# Altium footprint library my_AP_lib_pcb.PcbLib: 115 footprints (part 7 of 8)
Each footprint in its own frame and in the unit in brackets; x right, y up, seen from the top. Pads: shape width x height; smd on the part's side, far side on the other; paste and mask are expansions set on the pad; w line width, h text height; cw(c..) or ccw(c..) is an arc to the next point about the centre after c.
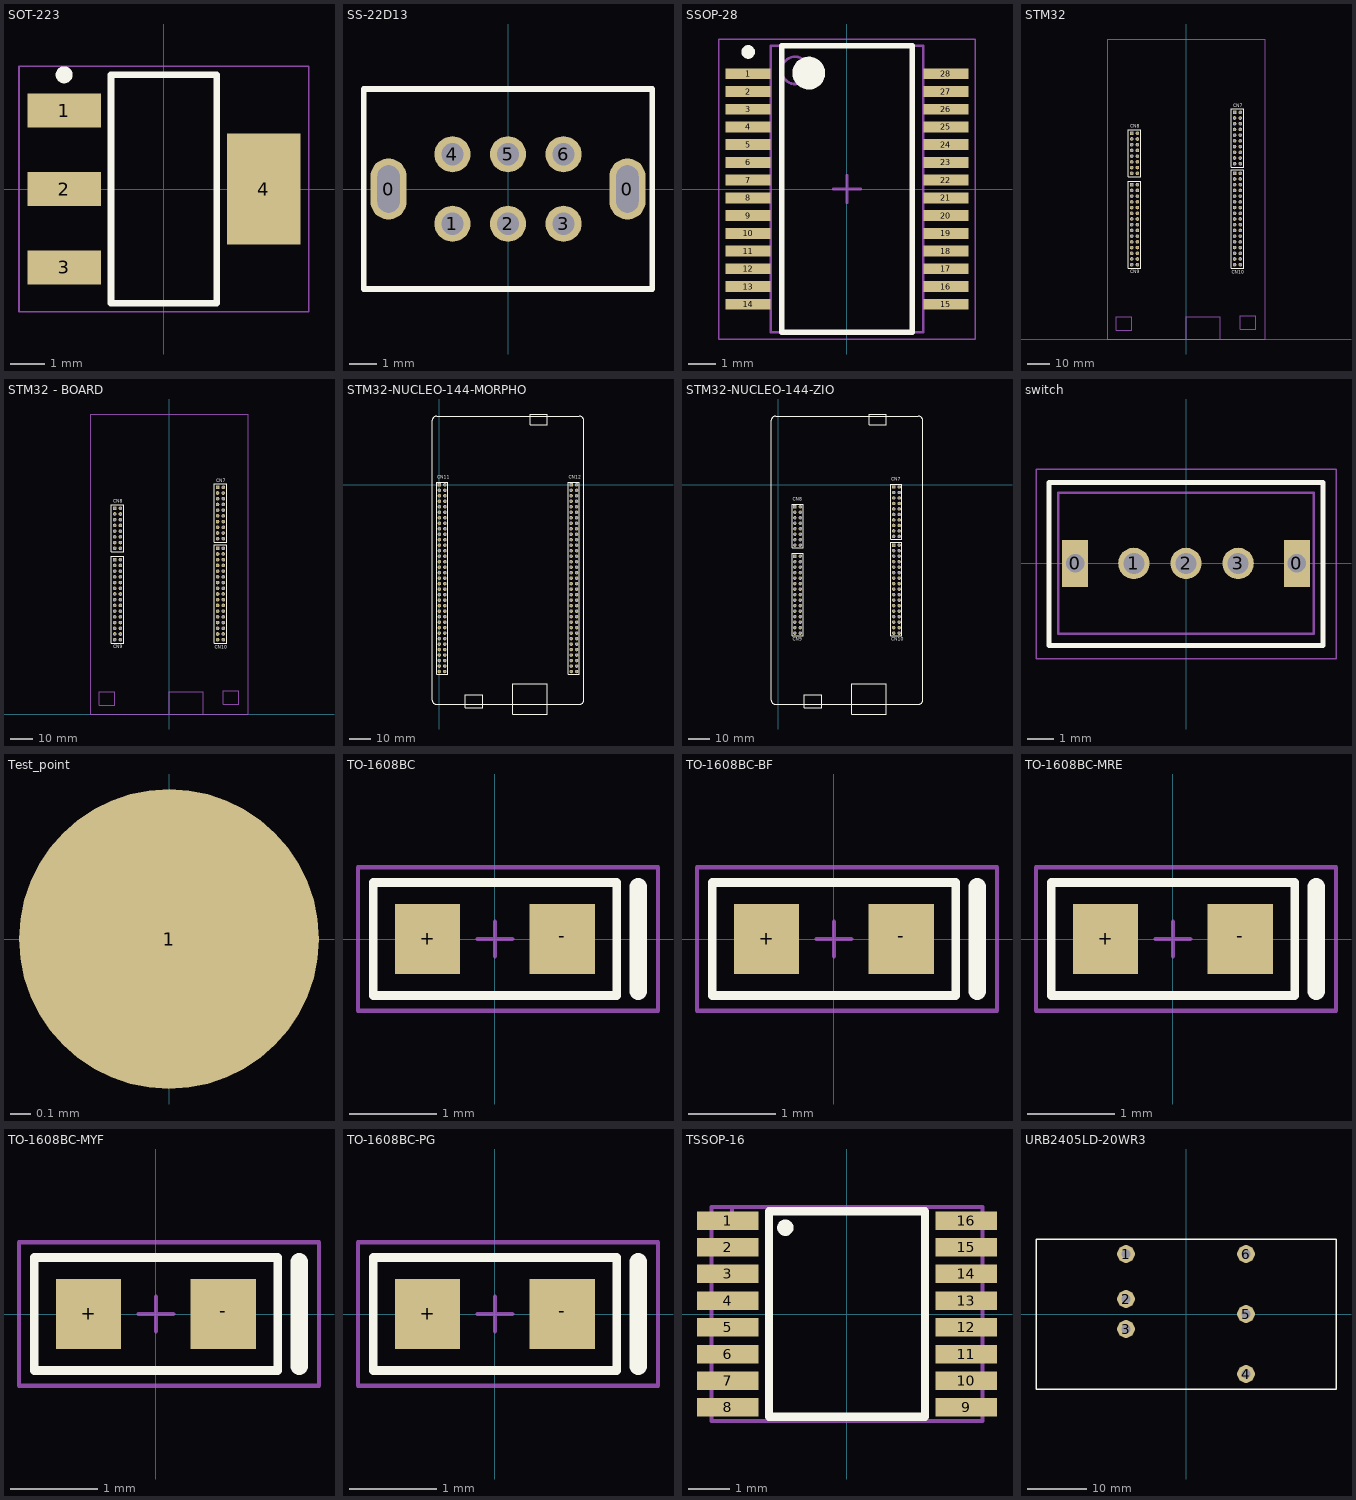
[diagram p6: the footprints below, top view; thin cyan lines are the x and y axes]

## SOT-223 [mm]
height 1.8
pads (4):
  rect 2.15x1 smd: 1(-2.925,2.3) 2(-2.925,0) 3(-2.925,-2.3)
  rect 2.15x3.25 smd: 4(2.925,0)
Top Overlay:
  circle w0.25: c-2.925,3.35 r0.125
  lines w0.2: -1.55,-3.35 1.55,-3.35 1.55,3.35 -1.55,3.35 -1.55,-3.35
Mechanical 15:
  lines w0.05: -4.25,-3.6 4.25,-3.6 4.25,3.6 -4.25,3.6 -4.25,-3.6
  text ".Designator" at -1.65,-0.2 h0.5
3D body "ALSRobot-SOT-223.step": height 1.64, standoff -0.01, extent -3.5,-3.25 3.5,3.25

## SS-22D13 [mm]
pads (8):
  oval 1.3x2.2 hole 0.8 slot 1.7 at 90 deg mask+0.05: 0(-4.3,0) 0(4.3,0)
  round 1.3 hole 0.8 mask+0.05: 1(-2,-1.25) 2(0,-1.25) 3(2,-1.25) 4(-2,1.25) 5(0,1.25) 6(2,1.25)
Top Overlay:
  lines w0.2: -5.2,-3.6 -5.2,3.6 5.2,3.6 5.2,-3.6 -5.2,-3.6
3D body "User Library-MFP213N.step": height 9, standoff -2.5, extent -4.3,-3.4 4.3,3.4

## SSOP-28 [mm] "SOP, 28-Leads, Body 10,20x5,30mm, Pitch 0,65mm, IPC Medium Density"
height 2
pads (28):
  rect 1.65x0.4 smd: 1(-3.625,4.225) 2(-3.625,3.575) 3(-3.625,2.925) 4(-3.625,2.275) 5(-3.625,1.625) 6(-3.625,0.975) 7(-3.625,0.325) 8(-3.625,-0.325) 9(-3.625,-0.975) 10(-3.625,-1.625) 11(-3.625,-2.275) 12(-3.625,-2.925) 13(-3.625,-3.575) 14(-3.625,-4.225) 15(3.625,-4.225) 16(3.625,-3.575) 17(3.625,-2.925) 18(3.625,-2.275) 19(3.625,-1.625) 20(3.625,-0.975) 21(3.625,-0.325) 22(3.625,0.325) 23(3.625,0.975) 24(3.625,1.625) 25(3.625,2.275) 26(3.625,2.925) 27(3.625,3.575) 28(3.625,4.225)
Top Overlay:
  circle w0.6: c-1.4,4.25 r0.3
  circle w0.25: c-3.625,5.025 r0.125
  lines w0.2: -2.4,-5.25 2.4,-5.25 2.4,5.25 -2.4,5.25 -2.4,-5.25
Mechanical 13:
  circle w0.1: c-1.9,4.35 r0.5
  lines w0.1: -2.8,-5.25 2.8,-5.25 2.8,5.25 -2.8,5.25 -2.8,-5.25
Mechanical 15:
  lines w0.05: -4.7,-5.5 4.7,-5.5 4.7,5.5 -4.7,5.5 -4.7,-5.5
  lines w0.1: -0.5,0 0.5,0 ; 0,-0.5 0,0.5
3D body "User Library-SSOP-28-2.step": height 2, standoff 0, extent -3.906,-5.1 3.906,5.1

## STM32 [mm]
pads (100):
  rect 1.6x1.6 hole 1.02 mask+0.05: 1(-24.13,91.44) 17(-24.13,68.58) 47(21.585,100.765) 67(21.59,73.66)
  round 1.6 hole 1.02 mask+0.05: 2(-21.59,91.44) 3(-24.13,88.9) 4(-21.59,88.9) 5(-24.13,86.36) 6(-21.59,86.36) 7(-24.13,83.82) 8(-21.59,83.82) 9(-24.13,81.28) 10(-21.59,81.28) 11(-24.13,78.74) 12(-21.59,78.74) 13(-24.13,76.2) 14(-21.59,76.2) 15(-24.13,73.66) 16(-21.59,73.66) 18(-21.59,68.58) 19(-24.13,66.04) 20(-21.59,66.04) 21(-24.13,63.5) 22(-21.59,63.5) 23(-24.13,60.96) 24(-21.59,60.96) 25(-24.13,58.42) 26(-21.59,58.42) 27(-24.13,55.88) 28(-21.59,55.88) 29(-24.13,53.34) 30(-21.59,53.34) 31(-24.13,50.8) 32(-21.59,50.8) 33(-24.13,48.26) 34(-21.59,48.26) 35(-24.13,45.72) 36(-21.59,45.72) 37(-24.13,43.18) 38(-21.59,43.18) 39(-24.13,40.64) 40(-21.59,40.64) 41(-24.13,38.1) 42(-21.59,38.1) 43(-24.13,35.56) 44(-21.59,35.56) 45(-24.13,33.02) 46(-21.59,33.02) 48(24.125,100.765) 49(21.585,98.225) 50(24.125,98.225) 51(21.585,95.685) 52(24.125,95.685) 53(21.585,93.145) 54(24.125,93.145) 55(21.585,90.605) 56(24.125,90.605) 57(21.585,88.065) 58(24.125,88.065) 59(21.585,85.525) 60(24.125,85.525) 61(21.585,82.985) 62(24.125,82.985) 63(21.585,80.445) 64(24.125,80.445) 65(21.585,77.905) 66(24.125,77.905) 68(24.13,73.66) 69(21.59,71.12) 70(24.13,71.12) 71(21.59,68.58) 72(24.13,68.58) 73(21.59,66.04) 74(24.13,66.04) 75(21.59,63.5) 76(24.13,63.5) 77(21.59,60.96) 78(24.13,60.96) 79(21.59,58.42) 80(24.13,58.42) 81(21.59,55.88) 82(24.13,55.88) 83(21.59,53.34) 84(24.13,53.34) 85(21.59,50.8) 86(24.13,50.8) 87(21.59,48.26) 88(24.13,48.26) 89(21.59,45.72) 90(24.13,45.72) 91(21.59,43.18) 92(24.13,43.18) 93(21.59,40.64) 94(24.13,40.64) 95(21.59,38.1) 96(24.13,38.1) 97(21.59,35.56) 98(24.13,35.56) 99(21.59,33.02) 100(24.13,33.02)
Top Overlay:
  lines w0.254: -25.56,31.5 -25.56,70.1 -20.06,70.1 -20.06,31.5 -25.56,31.5 ; -25.56,72.14 -20.06,72.14 -20.06,92.96 -25.56,92.96 -25.56,72.14 ; 20.155,76.385 25.655,76.385 25.655,102.285 20.155,102.285 20.155,76.385 ; 20.16,31.5 25.66,31.5 25.66,75.18 20.16,75.18 20.16,31.5
  text "CN7" at 20.9,103 h1.52
  text "CN10" at 20.3,29 h1.52
  text "CN9" at -24.7,29.2 h1.52
  text "CN8" at -24.8,93.8 h1.52
Mechanical 1:
  lines w0.254: -35,0 -35,133.34 35,133.34 35,0 -35,0 ; -30.9,4 -24.1,4 -24.1,10 -30.9,10 -30.9,4 ; 0,0 0,10 15.2,10 15.2,0 0,0 ; 24.1,4.3 30.9,4.3 30.9,10.3 24.1,10.3 24.1,4.3
  text "BTN1" at -30,6.1 h1.52
  text "BTN2" at 24.7,6.7 h1.52
3D body "User Library-PBS-09.step": height 8.4, standoff -3.2, extent 22.88,31.81 25.42,54.67
3D body "User Library-PBS-09.step": height 8.4, standoff -3.2, extent 20.34,31.81 22.88,54.67
3D body "User Library-PBS-06.step": height 8.4, standoff -3.2, extent 22.86,54.61 25.4,69.85
3D body "User Library-PBS-02.step": height 8.4, standoff -3.2, extent 22.86,69.81 25.4,74.89
3D body "User Library-PBS-06.step": height 8.4, standoff -3.2, extent 20.32,54.61 22.86,69.85
3D body "User Library-PBS-02.step": height 8.4, standoff -3.2, extent 20.32,69.81 22.86,74.89
3D body "User Library-PBS-06.step": height 8.4, standoff -3.2, extent -22.86,54.61 -20.32,69.85
3D body "User Library-PBS-06.step": height 8.4, standoff -3.2, extent -25.4,54.61 -22.86,69.85
3D body "User Library-PBS-09.step": height 8.4, standoff -3.2, extent -22.84,31.81 -20.3,54.67
3D body "User Library-PBS-09.step": height 8.4, standoff -3.2, extent -25.38,31.81 -22.84,54.67
3D body "User Library-PBS-09.step": height 8.4, standoff -3.2, extent 20.335,76.695 22.875,99.555
3D body "User Library-PBS-09.step": height 8.4, standoff -3.2, extent 22.875,76.695 25.415,99.555
3D body "User Library-PBS-02.step": height 8.4, standoff -3.2, extent 20.355,99.495 25.435,102.035
3D body "User Library-PBS-02.step": height 8.4, standoff -3.2, extent -25.4,87.59 -22.86,92.67
3D body "User Library-PBS-06.step": height 8.4, standoff -3.2, extent -25.4,72.39 -22.86,87.63
3D body "User Library-PBS-02.step": height 8.4, standoff -3.2, extent -22.86,87.59 -20.32,92.67
3D body "User Library-PBS-06.step": height 8.4, standoff -3.2, extent -22.86,72.39 -20.32,87.63

## STM32 - BOARD [mm]
pads (100):
  rect 1.6x1.6 hole 1.02 mask+0.05: 1(-24.13,91.44) 17(-24.13,68.58) 47(21.585,100.765) 67(21.59,73.66)
  round 1.6 hole 1.02 mask+0.05: 2(-21.59,91.44) 3(-24.13,88.9) 4(-21.59,88.9) 5(-24.13,86.36) 6(-21.59,86.36) 7(-24.13,83.82) 8(-21.59,83.82) 9(-24.13,81.28) 10(-21.59,81.28) 11(-24.13,78.74) 12(-21.59,78.74) 13(-24.13,76.2) 14(-21.59,76.2) 15(-24.13,73.66) 16(-21.59,73.66) 18(-21.59,68.58) 19(-24.13,66.04) 20(-21.59,66.04) 21(-24.13,63.5) 22(-21.59,63.5) 23(-24.13,60.96) 24(-21.59,60.96) 25(-24.13,58.42) 26(-21.59,58.42) 27(-24.13,55.88) 28(-21.59,55.88) 29(-24.13,53.34) 30(-21.59,53.34) 31(-24.13,50.8) 32(-21.59,50.8) 33(-24.13,48.26) 34(-21.59,48.26) 35(-24.13,45.72) 36(-21.59,45.72) 37(-24.13,43.18) 38(-21.59,43.18) 39(-24.13,40.64) 40(-21.59,40.64) 41(-24.13,38.1) 42(-21.59,38.1) 43(-24.13,35.56) 44(-21.59,35.56) 45(-24.13,33.02) 46(-21.59,33.02) 48(24.125,100.765) 49(21.585,98.225) 50(24.125,98.225) 51(21.585,95.685) 52(24.125,95.685) 53(21.585,93.145) 54(24.125,93.145) 55(21.585,90.605) 56(24.125,90.605) 57(21.585,88.065) 58(24.125,88.065) 59(21.585,85.525) 60(24.125,85.525) 61(21.585,82.985) 62(24.125,82.985) 63(21.585,80.445) 64(24.125,80.445) 65(21.585,77.905) 66(24.125,77.905) 68(24.13,73.66) 69(21.59,71.12) 70(24.13,71.12) 71(21.59,68.58) 72(24.13,68.58) 73(21.59,66.04) 74(24.13,66.04) 75(21.59,63.5) 76(24.13,63.5) 77(21.59,60.96) 78(24.13,60.96) 79(21.59,58.42) 80(24.13,58.42) 81(21.59,55.88) 82(24.13,55.88) 83(21.59,53.34) 84(24.13,53.34) 85(21.59,50.8) 86(24.13,50.8) 87(21.59,48.26) 88(24.13,48.26) 89(21.59,45.72) 90(24.13,45.72) 91(21.59,43.18) 92(24.13,43.18) 93(21.59,40.64) 94(24.13,40.64) 95(21.59,38.1) 96(24.13,38.1) 97(21.59,35.56) 98(24.13,35.56) 99(21.59,33.02) 100(24.13,33.02)
Top Overlay:
  lines w0.254: -25.56,31.5 -25.56,70.1 -20.06,70.1 -20.06,31.5 -25.56,31.5 ; -25.56,72.14 -20.06,72.14 -20.06,92.96 -25.56,92.96 -25.56,72.14 ; 20.155,76.385 25.655,76.385 25.655,102.285 20.155,102.285 20.155,76.385 ; 20.16,31.5 25.66,31.5 25.66,75.18 20.16,75.18 20.16,31.5
  text "CN7" at 20.9,103 h1.52
  text "CN10" at 20.3,29 h1.52
  text "CN9" at -24.7,29.2 h1.52
  text "CN8" at -24.8,93.8 h1.52
Mechanical 1:
  lines w0.254: -35,0 -35,133.34 35,133.34 35,0 -35,0 ; -30.9,4 -24.1,4 -24.1,10 -30.9,10 -30.9,4 ; 0,0 0,10 15.2,10 15.2,0 0,0 ; 24.1,4.3 30.9,4.3 30.9,10.3 24.1,10.3 24.1,4.3
  text "BTN1" at -30,6.1 h1.52
  text "BTN2" at 24.7,6.7 h1.52
3D body "User Library-PBS-09.step": height 8.4, standoff -3.2, extent 22.88,31.81 25.42,54.67
3D body "User Library-PBS-09.step": height 8.4, standoff -3.2, extent 20.34,31.81 22.88,54.67
3D body "User Library-PBS-06.step": height 8.4, standoff -3.2, extent 22.86,54.61 25.4,69.85
3D body "User Library-PBS-02.step": height 8.4, standoff -3.2, extent 22.86,69.81 25.4,74.89
3D body "User Library-PBS-06.step": height 8.4, standoff -3.2, extent 20.32,54.61 22.86,69.85
3D body "User Library-PBS-02.step": height 8.4, standoff -3.2, extent 20.32,69.81 22.86,74.89
3D body "User Library-PBS-06.step": height 8.4, standoff -3.2, extent -22.86,54.61 -20.32,69.85
3D body "User Library-PBS-06.step": height 8.4, standoff -3.2, extent -25.4,54.61 -22.86,69.85
3D body "User Library-PBS-09.step": height 8.4, standoff -3.2, extent -22.84,31.81 -20.3,54.67
3D body "User Library-PBS-09.step": height 8.4, standoff -3.2, extent -25.38,31.81 -22.84,54.67
3D body "User Library-PBS-09.step": height 8.4, standoff -3.2, extent 20.335,76.695 22.875,99.555
3D body "User Library-PBS-09.step": height 8.4, standoff -3.2, extent 22.875,76.695 25.415,99.555
3D body "User Library-PBS-02.step": height 8.4, standoff -3.2, extent 20.355,99.495 25.435,102.035
3D body "User Library-PBS-02.step": height 8.4, standoff -3.2, extent -25.4,87.59 -22.86,92.67
3D body "User Library-PBS-06.step": height 8.4, standoff -3.2, extent -25.4,72.39 -22.86,87.63
3D body "User Library-PBS-02.step": height 8.4, standoff -3.2, extent -22.86,87.59 -20.32,92.67
3D body "User Library-PBS-06.step": height 8.4, standoff -3.2, extent -22.86,72.39 -20.32,87.63
3D body "MB1363.step": height 19.56, standoff 0.99, extent -35,-3.9 35,134.658

## STM32-NUCLEO-144-MORPHO [mm]
pads (140):
  rect 1.6x1.6 hole 1: CN11_1(0,0) CN12_1(60.96,0)
  round 1.6 hole 1: CN11_2(2.54,0) CN11_3(0,-2.54) CN11_4(2.54,-2.54) CN11_5(0,-5.08) CN11_6(2.54,-5.08) CN11_7(0,-7.62) CN11_8(2.54,-7.62) CN11_9(0,-10.16) CN11_10(2.54,-10.16) CN11_11(0,-12.7) CN11_12(2.54,-12.7) CN11_13(0,-15.24) CN11_14(2.54,-15.24) CN11_15(0,-17.78) CN11_16(2.54,-17.78) CN11_17(0,-20.32) CN11_18(2.54,-20.32) CN11_19(0,-22.86) CN11_20(2.54,-22.86) CN11_21(0,-25.4) CN11_22(2.54,-25.4) CN11_23(0,-27.94) CN11_24(2.54,-27.94) CN11_25(0,-30.48) CN11_26(2.54,-30.48) CN11_27(0,-33.02) CN11_28(2.54,-33.02) CN11_29(0,-35.56) CN11_30(2.54,-35.56) CN11_31(0,-38.1) CN11_32(2.54,-38.1) CN11_33(0,-40.64) CN11_34(2.54,-40.64) CN11_35(0,-43.18) CN11_36(2.54,-43.18) CN11_37(0,-45.72) CN11_38(2.54,-45.72) CN11_39(0,-48.26) CN11_40(2.54,-48.26) CN11_41(0,-50.8) CN11_42(2.54,-50.8) CN11_43(0,-53.34) CN11_44(2.54,-53.34) CN11_45(0,-55.88) CN11_46(2.54,-55.88) CN11_47(0,-58.42) CN11_48(2.54,-58.42) CN11_49(0,-60.96) CN11_50(2.54,-60.96) CN11_51(0,-63.5) CN11_52(2.54,-63.5) CN11_53(0,-66.04) CN11_54(2.54,-66.04) CN11_55(0,-68.58) CN11_56(2.54,-68.58) CN11_57(0,-71.12) CN11_58(2.54,-71.12) CN11_59(0,-73.66) CN11_60(2.54,-73.66) CN11_61(0,-76.2) CN11_62(2.54,-76.2) CN11_63(0,-78.74) CN11_64(2.54,-78.74) CN11_65(0,-81.28) CN11_66(2.54,-81.28) CN11_67(0,-83.82) CN11_68(2.54,-83.82) CN11_69(0,-86.36) CN11_70(2.54,-86.36) CN12_2(63.5,0) CN12_3(60.96,-2.54) CN12_4(63.5,-2.54) CN12_5(60.96,-5.08) CN12_6(63.5,-5.08) CN12_7(60.96,-7.62) CN12_8(63.5,-7.62) CN12_9(60.96,-10.16) CN12_10(63.5,-10.16) CN12_11(60.96,-12.7) CN12_12(63.5,-12.7) CN12_13(60.96,-15.24) CN12_14(63.5,-15.24) CN12_15(60.96,-17.78) CN12_16(63.5,-17.78) CN12_17(60.96,-20.32) CN12_18(63.5,-20.32) CN12_19(60.96,-22.86) CN12_20(63.5,-22.86) CN12_21(60.96,-25.4) CN12_22(63.5,-25.4) CN12_23(60.96,-27.94) CN12_24(63.5,-27.94) CN12_25(60.96,-30.48) CN12_26(63.5,-30.48) CN12_27(60.96,-33.02) CN12_28(63.5,-33.02) CN12_29(60.96,-35.56) CN12_30(63.5,-35.56) CN12_31(60.96,-38.1) CN12_32(63.5,-38.1) CN12_33(60.96,-40.64) CN12_34(63.5,-40.64) CN12_35(60.96,-43.18) CN12_36(63.5,-43.18) CN12_37(60.96,-45.72) CN12_38(63.5,-45.72) CN12_39(60.96,-48.26) CN12_40(63.5,-48.26) CN12_41(60.96,-50.8) CN12_42(63.5,-50.8) CN12_43(60.96,-53.34) CN12_44(63.5,-53.34) CN12_45(60.96,-55.88) CN12_46(63.5,-55.88) CN12_47(60.96,-58.42) CN12_48(63.5,-58.42) CN12_49(60.96,-60.96) CN12_50(63.5,-60.96) CN12_51(60.96,-63.5) CN12_52(63.5,-63.5) CN12_53(60.96,-66.04) CN12_54(63.5,-66.04) CN12_55(60.96,-68.58) CN12_56(63.5,-68.58) CN12_57(60.96,-71.12) CN12_58(63.5,-71.12) CN12_59(60.96,-73.66) CN12_60(63.5,-73.66) CN12_61(60.96,-76.2) CN12_62(63.5,-76.2) CN12_63(60.96,-78.74) CN12_64(63.5,-78.74) CN12_65(60.96,-81.28) CN12_66(63.5,-81.28) CN12_67(60.96,-83.82) CN12_68(63.5,-83.82) CN12_69(60.96,-86.36) CN12_70(63.5,-86.36)
Top Overlay:
  lines w0.1: -3.25,-99.6 ccw(c-1.25,-99.6) -1.25,-101.6 64.75,-101.6 ccw(c64.75,-99.6) 66.75,-99.6 66.75,29.74 ccw(c64.75,29.74) 64.75,31.74 -1.25,31.74 ccw(c-1.25,29.74) -3.25,29.74 -3.25,-99.6 ; -1.27,-87.63 -1.27,1.27 3.81,1.27 3.81,-87.63 -1.27,-87.63 ; 12,-103 12,-97 20,-97 20,-103 12,-103 ; 34,-106 50,-106 50,-92 34,-92 34,-106 ; 42,27.74 42,32.74 50,32.74 50,27.74 42,27.74 ; 59.69,-87.63 59.69,1.27 64.77,1.27 64.77,-87.63 59.69,-87.63
  text "CN11" at -1.016,2.794 h1.52
  text "CN12" at 59.944,2.794 h1.52

## STM32-NUCLEO-144-ZIO [mm]
pads (100):
  rect 1.6x1.6 hole 1: CN7_1(53.34,-1.016) CN8_1(7.62,-10.16) CN9_1(7.62,-33.02) CN10_1(53.34,-27.94)
  round 1.6 hole 1: CN7_2(55.88,-1.016) CN7_3(53.34,-3.556) CN7_4(55.88,-3.556) CN7_5(53.34,-6.096) CN7_6(55.88,-6.096) CN7_7(53.34,-8.636) CN7_8(55.88,-8.636) CN7_9(53.34,-11.176) CN7_10(55.88,-11.176) CN7_11(53.34,-13.716) CN7_12(55.88,-13.716) CN7_13(53.34,-16.256) CN7_14(55.88,-16.256) CN7_15(53.34,-18.796) CN7_16(55.88,-18.796) CN7_17(53.34,-21.336) CN7_18(55.88,-21.336) CN7_19(53.34,-23.876) CN7_20(55.88,-23.876) CN8_2(10.16,-10.16) CN8_3(7.62,-12.7) CN8_4(10.16,-12.7) CN8_5(7.62,-15.24) CN8_6(10.16,-15.24) CN8_7(7.62,-17.78) CN8_8(10.16,-17.78) CN8_9(7.62,-20.32) CN8_10(10.16,-20.32) CN8_11(7.62,-22.86) CN8_12(10.16,-22.86) CN8_13(7.62,-25.4) CN8_14(10.16,-25.4) CN8_15(7.62,-27.94) CN8_16(10.16,-27.94) CN9_2(10.16,-33.02) CN9_3(7.62,-35.56) CN9_4(10.16,-35.56) CN9_5(7.62,-38.1) CN9_6(10.16,-38.1) CN9_7(7.62,-40.64) CN9_8(10.16,-40.64) CN9_9(7.62,-43.18) CN9_10(10.16,-43.18) CN9_11(7.62,-45.72) CN9_12(10.16,-45.72) CN9_13(7.62,-48.26) CN9_14(10.16,-48.26) CN9_15(7.62,-50.8) CN9_16(10.16,-50.8) CN9_17(7.62,-53.34) CN9_18(10.16,-53.34) CN9_19(7.62,-55.88) CN9_20(10.16,-55.88) CN9_21(7.62,-58.42) CN9_22(10.16,-58.42) CN9_23(7.62,-60.96) CN9_24(10.16,-60.96) CN9_25(7.62,-63.5) CN9_26(10.16,-63.5) CN9_27(7.62,-66.04) CN9_28(10.16,-66.04) CN9_29(7.62,-68.58) CN9_30(10.16,-68.58) CN10_2(55.88,-27.94) CN10_3(53.34,-30.48) CN10_4(55.88,-30.48) CN10_5(53.34,-33.02) CN10_6(55.88,-33.02) CN10_7(53.34,-35.56) CN10_8(55.88,-35.56) CN10_9(53.34,-38.1) CN10_10(55.88,-38.1) CN10_11(53.34,-40.64) CN10_12(55.88,-40.64) CN10_13(53.34,-43.18) CN10_14(55.88,-43.18) CN10_15(53.34,-45.72) CN10_16(55.88,-45.72) CN10_17(53.34,-48.26) CN10_18(55.88,-48.26) CN10_19(53.34,-50.8) CN10_20(55.88,-50.8) CN10_21(53.34,-53.34) CN10_22(55.88,-53.34) CN10_23(53.34,-55.88) CN10_24(55.88,-55.88) CN10_25(53.34,-58.42) CN10_26(55.88,-58.42) CN10_27(53.34,-60.96) CN10_28(55.88,-60.96) CN10_29(53.34,-63.5) CN10_30(55.88,-63.5) CN10_31(53.34,-66.04) CN10_32(55.88,-66.04) CN10_33(53.34,-68.58) CN10_34(55.88,-68.58)
Top Overlay:
  lines w0.1: 52.07,-69.85 52.07,-26.67 57.15,-26.67 57.15,-69.85 52.07,-69.85 ; 52.07,-25.146 57.15,-25.146 57.15,0.254 52.07,0.254 52.07,-25.146
  lines w0.15: -3.25,-99.6 ccw(c-1.25,-99.6) -1.25,-101.6 64.75,-101.6 ccw(c64.75,-99.6) 66.75,-99.6 66.75,29.74 ccw(c64.75,29.74) 64.75,31.74 -1.25,31.74 ccw(c-1.25,29.74) -3.25,29.74 -3.25,-99.6 ; 6.35,-69.85 6.35,-31.75 11.43,-31.75 11.43,-69.85 6.35,-69.85 ; 6.35,-29.21 6.35,-8.89 11.43,-8.89 11.43,-29.21 6.35,-29.21 ; 12,-103 20,-103 20,-97 12,-97 12,-103 ; 34,-106 34,-92 50,-92 50,-106 34,-106 ; 42,27.74 50,27.74 50,32.74 42,32.74 42,27.74
  text "CN10" at 52.324,-72.136 h1.52
  text "CN7" at 52.324,1.778 h1.52
  text "CN9" at 6.604,-72.136 h1.52
  text "CN8" at 6.604,-7.366 h1.52
3D body "User Library-PBS-02.step": height 8.4, standoff -3.2, extent 6.31,-11.43 11.39,-8.89
3D body "User Library-PBS-02.step": height 8.4, standoff -3.2, extent 6.31,-13.97 11.39,-11.43
3D body "User Library-PBS-02.step": height 8.4, standoff -3.2, extent 6.31,-16.51 11.39,-13.97
3D body "User Library-PBS-02.step": height 8.4, standoff -3.2, extent 6.31,-19.05 11.39,-16.51
3D body "User Library-PBS-02.step": height 8.4, standoff -3.2, extent 6.31,-21.59 11.39,-19.05
3D body "User Library-PBS-02.step": height 8.4, standoff -3.2, extent 6.31,-24.13 11.39,-21.59
3D body "User Library-PBS-02.step": height 8.4, standoff -3.2, extent 6.31,-26.67 11.39,-24.13
3D body "User Library-PBS-02.step": height 8.4, standoff -3.2, extent 6.31,-29.21 11.39,-26.67
3D body "User Library-PBS-02.step": height 8.4, standoff -3.2, extent 6.31,-34.29 11.39,-31.75
3D body "User Library-PBS-02.step": height 8.4, standoff -3.2, extent 6.31,-36.83 11.39,-34.29
3D body "User Library-PBS-02.step": height 8.4, standoff -3.2, extent 6.31,-39.37 11.39,-36.83
3D body "User Library-PBS-02.step": height 8.4, standoff -3.2, extent 6.31,-41.91 11.39,-39.37
3D body "User Library-PBS-02.step": height 8.4, standoff -3.2, extent 6.31,-44.45 11.39,-41.91
3D body "User Library-PBS-02.step": height 8.4, standoff -3.2, extent 6.31,-46.99 11.39,-44.45
3D body "User Library-PBS-02.step": height 8.4, standoff -3.2, extent 6.31,-49.53 11.39,-46.99
3D body "User Library-PBS-02.step": height 8.4, standoff -3.2, extent 6.31,-52.07 11.39,-49.53
3D body "User Library-PBS-02.step": height 8.4, standoff -3.2, extent 6.31,-54.61 11.39,-52.07
3D body "User Library-PBS-02.step": height 8.4, standoff -3.2, extent 6.31,-57.15 11.39,-54.61
3D body "User Library-PBS-02.step": height 8.4, standoff -3.2, extent 6.31,-59.69 11.39,-57.15
3D body "User Library-PBS-02.step": height 8.4, standoff -3.2, extent 6.31,-62.23 11.39,-59.69
3D body "User Library-PBS-02.step": height 8.4, standoff -3.2, extent 6.31,-64.77 11.39,-62.23
3D body "User Library-PBS-02.step": height 8.4, standoff -3.2, extent 6.31,-67.31 11.39,-64.77
3D body "User Library-PBS-02.step": height 8.4, standoff -3.2, extent 6.31,-69.85 11.39,-67.31
3D body "User Library-PBS-02.step": height 8.4, standoff -3.2, extent 52.03,-57.15 57.11,-54.61
3D body "User Library-PBS-02.step": height 8.4, standoff -3.2, extent 52.03,-59.69 57.11,-57.15
3D body "User Library-PBS-02.step": height 8.4, standoff -3.2, extent 52.03,-62.23 57.11,-59.69
3D body "User Library-PBS-02.step": height 8.4, standoff -3.2, extent 52.03,-64.77 57.11,-62.23
3D body "User Library-PBS-02.step": height 8.4, standoff -3.2, extent 52.03,-67.31 57.11,-64.77
3D body "User Library-PBS-02.step": height 8.4, standoff -3.2, extent 52.03,-69.85 57.11,-67.31
3D body "User Library-PBS-02.step": height 8.4, standoff -3.2, extent 52.03,-41.91 57.11,-39.37
3D body "User Library-PBS-02.step": height 8.4, standoff -3.2, extent 52.03,-44.45 57.11,-41.91
3D body "User Library-PBS-02.step": height 8.4, standoff -3.2, extent 52.03,-46.99 57.11,-44.45
3D body "User Library-PBS-02.step": height 8.4, standoff -3.2, extent 52.03,-49.53 57.11,-46.99
3D body "User Library-PBS-02.step": height 8.4, standoff -3.2, extent 52.03,-52.07 57.11,-49.53
3D body "User Library-PBS-02.step": height 8.4, standoff -3.2, extent 52.03,-54.61 57.11,-52.07
3D body "User Library-PBS-02.step": height 8.4, standoff -3.2, extent 52.03,-29.21 57.11,-26.67
3D body "User Library-PBS-02.step": height 8.4, standoff -3.2, extent 52.03,-31.75 57.11,-29.21
3D body "User Library-PBS-02.step": height 8.4, standoff -3.2, extent 52.03,-34.29 57.11,-31.75
3D body "User Library-PBS-02.step": height 8.4, standoff -3.2, extent 52.03,-36.83 57.11,-34.29
3D body "User Library-PBS-02.step": height 8.4, standoff -3.2, extent 52.03,-39.37 57.11,-36.83
3D body "User Library-PBS-02.step": height 8.4, standoff -3.2, extent 52.03,-12.446 57.11,-9.906
3D body "User Library-PBS-02.step": height 8.4, standoff -3.2, extent 52.03,-14.986 57.11,-12.446
3D body "User Library-PBS-02.step": height 8.4, standoff -3.2, extent 52.03,-17.526 57.11,-14.986
3D body "User Library-PBS-02.step": height 8.4, standoff -3.2, extent 52.03,-20.066 57.11,-17.526
3D body "User Library-PBS-02.step": height 8.4, standoff -3.2, extent 52.03,-22.606 57.11,-20.066
3D body "User Library-PBS-02.step": height 8.4, standoff -3.2, extent 52.03,-25.146 57.11,-22.606
3D body "User Library-PBS-02.step": height 8.4, standoff -3.2, extent 52.03,-2.286 57.11,0.254
3D body "User Library-PBS-02.step": height 8.4, standoff -3.2, extent 52.03,-4.826 57.11,-2.286
3D body "User Library-PBS-02.step": height 8.4, standoff -3.2, extent 52.03,-7.366 57.11,-4.826
3D body "User Library-PBS-02.step": height 8.4, standoff -3.2, extent 52.03,-9.906 57.11,-7.366

## switch [mm]
height 11.6
pads (5):
  rect 1x1.8 hole 0.7 square mask+0.05: 0(-4.25,0) 0(4.25,0)
  round 1.2 hole 0.8 mask+0.05: 1(-2,0) 2(0,0) 3(2,0)
Top Overlay:
  lines w0.2: -5.25,-3.15 5.25,-3.15 5.25,3.1 -5.25,3.1 -5.25,-3.15
Mechanical 5:
  lines w0.1: -4.9,-2.7 4.9,-2.7 4.9,2.7 -4.9,2.7 -4.9,-2.7
  text ".Designator" at -3.75,-1.4 h3
Mechanical 9:
  lines w0.05: -5.75,-3.65 5.75,-3.65 5.75,3.6 -5.75,3.6 -5.75,-3.65
3D body "User Library-KLS7-SS03-12D02-EG-3.STEP": height 7.33, standoff -2.8, extent -4.35,-2.25 4.35,2.25

## Test_point [mm]
pads (1):
  round 1.5 smd mask+0.07: 1(0,0)

## TO-1608BC [mm] "LED SMD 1608"
height 0.6
pads (2):
  rect 0.75x0.8 smd: +(-0.775,0) -(0.775,0)
Top Overlay:
  lines w0.1: -1.4,-0.65 -1.4,0.65 1.4,0.65 1.4,-0.65 -1.4,-0.65
  lines w0.2: 1.65,-0.6 1.65,0.6
Mechanical 15:
  lines w0.05: -0.2,0 0.2,0 ; 0,-0.2 0,0.2 ; -1.575,-0.825 -1.575,0.825 1.875,0.825 1.875,-0.825 -1.575,-0.825
3D body: height 0.28, standoff 0, extent -0.8,-0.4 0,0.4
3D body: height 0.28, standoff 0, extent 0,-0.4 0.8,0.4
3D body: height 0.6, standoff 0.28, extent -0.5,-0.4 0.5,0.4
3D body: height 0.29, standoff 0.28, extent 0.5,-0.4 0.8,0.4

## TO-1608BC-BF [mm] "LED SMD 1608 247мКд, 120°, 468нМ (Blue)"
height 0.6
pads (2):
  rect 0.75x0.8 smd: +(-0.775,0) -(0.775,0)
Top Overlay:
  lines w0.1: -1.4,-0.65 1.4,-0.65 1.4,0.65 -1.4,0.65 -1.4,-0.65
  lines w0.2: 1.65,-0.6 1.65,0.6
Mechanical 15:
  lines w0.05: -0.2,0 0.2,0 ; 0,-0.2 0,0.2 ; -1.575,-0.825 1.875,-0.825 1.875,0.825 -1.575,0.825 -1.575,-0.825
3D body: height 0.29, standoff 0.28, extent 0.5,-0.4 0.8,0.4
3D body: height 0.6, standoff 0.28, extent -0.5,-0.4 0.5,0.4
3D body: height 0.28, standoff 0, extent 0,-0.4 0.8,0.4
3D body: height 0.28, standoff 0, extent -0.8,-0.4 0,0.4

## TO-1608BC-MRE [mm] "LED SMD 1608 112мКд, 120°, 630нМ (Ultra Bright Red)"
height 0.6
pads (2):
  rect 0.75x0.8 smd: +(-0.775,0) -(0.775,0)
Top Overlay:
  lines w0.1: -1.4,-0.65 -1.4,0.65 1.4,0.65 1.4,-0.65 -1.4,-0.65
  lines w0.2: 1.65,-0.6 1.65,0.6
Mechanical 15:
  lines w0.05: -0.2,0 0.2,0 ; 0,-0.2 0,0.2 ; -1.575,-0.825 -1.575,0.825 1.875,0.825 1.875,-0.825 -1.575,-0.825
3D body: height 0.28, standoff 0, extent -0.8,-0.4 0,0.4
3D body: height 0.28, standoff 0, extent 0,-0.4 0.8,0.4
3D body: height 0.6, standoff 0.28, extent -0.5,-0.4 0.5,0.4
3D body: height 0.29, standoff 0.28, extent 0.5,-0.4 0.8,0.4

## TO-1608BC-MYF [mm] "LED SMD 1608, 247мКд, 120°, 592нМ (High Bright Yellow)"
height 0.6
pads (2):
  rect 0.75x0.8 smd: +(-0.775,0) -(0.775,0)
Top Overlay:
  lines w0.1: -1.4,-0.65 -1.4,0.65 1.4,0.65 1.4,-0.65 -1.4,-0.65
  lines w0.2: 1.65,-0.6 1.65,0.6
Mechanical 15:
  lines w0.05: -0.2,0 0.2,0 ; 0,-0.2 0,0.2 ; -1.575,-0.825 -1.575,0.825 1.875,0.825 1.875,-0.825 -1.575,-0.825
3D body: height 0.28, standoff 0, extent -0.8,-0.4 0,0.4
3D body: height 0.28, standoff 0, extent 0,-0.4 0.8,0.4
3D body: height 0.6, standoff 0.28, extent -0.5,-0.4 0.5,0.4
3D body: height 0.29, standoff 0.28, extent 0.5,-0.4 0.8,0.4

## TO-1608BC-PG [mm] "LED SMD 1608 705мКд, 120°, 525нМ (Pure Green)"
height 0.6
pads (2):
  rect 0.75x0.8 smd: +(-0.775,0) -(0.775,0)
Top Overlay:
  lines w0.1: -1.4,-0.65 1.4,-0.65 1.4,0.65 -1.4,0.65 -1.4,-0.65
  lines w0.2: 1.65,-0.6 1.65,0.6
Mechanical 15:
  lines w0.05: -0.2,0 0.2,0 ; 0,-0.2 0,0.2 ; -1.575,-0.825 1.875,-0.825 1.875,0.825 -1.575,0.825 -1.575,-0.825
3D body: height 0.29, standoff 0.28, extent 0.5,-0.4 0.8,0.4
3D body: height 0.6, standoff 0.28, extent -0.5,-0.4 0.5,0.4
3D body: height 0.28, standoff 0, extent 0,-0.4 0.8,0.4
3D body: height 0.28, standoff 0, extent -0.8,-0.4 0,0.4

## TSSOP-16 [mm]
pads (16):
  rect 1.5x0.45 smd: 1(-2.9,2.275) 2(-2.9,1.625) 3(-2.9,0.975) 4(-2.9,0.325) 5(-2.9,-0.325) 6(-2.9,-0.975) 7(-2.9,-1.625) 8(-2.9,-2.275) 9(2.9,-2.275) 10(2.9,-1.625) 11(2.9,-0.975) 12(2.9,-0.325) 13(2.9,0.325) 14(2.9,0.975) 15(2.9,1.625) 16(2.9,2.275)
Top Overlay:
  circle w0.2: c-1.5,2.1 r0.1
  lines w0.2: -1.9,-2.5 1.9,-2.5 1.9,2.5 -1.9,2.5 -1.9,-2.5
Mechanical 15:
  lines w0.1: -3.3,2.1 -2.8,2.1 -2.8,2.6 ; -3.3,-2.6 -3.3,2.6 3.3,2.6 3.3,-2.6 -3.3,-2.6
  text ".Designator" at -1.8,-0.125 h0.5
3D body "TSSOP-16.step": height 1.06, standoff -0.01, extent -3.25,-2.55 3.25,2.55

## URB2405LD-20WR3 [mm] "DC/DC, Vin 9-36V, Vout 5V/4A"
pads (6):
  round 3 hole 1.5: 1(-10.16,10.16) 2(-10.16,2.54) 3(-10.16,-2.54) 4(10.16,-10.16) 5(10.16,0) 6(10.16,10.16)
Top Overlay:
  lines w0.254: -25.4,-12.7 25.4,-12.7 25.4,12.7 -25.4,12.7 -25.4,-12.7
3D body "URB_LD-20WR3.stp": height 11.8, standoff -4.1, extent -25.4,-12.7 25.4,12.7